# Altium footprint library PHOENIX THD.PcbLib: 109 footprints (part 5 of 8)
Each footprint in its own frame and in the unit in brackets; x right, y up, seen from the top. Pads: shape width x height; smd on the part's side, far side on the other; paste and mask are expansions set on the pad; w line width, h text height; cw(c..) or ccw(c..) is an arc to the next point about the centre after c.
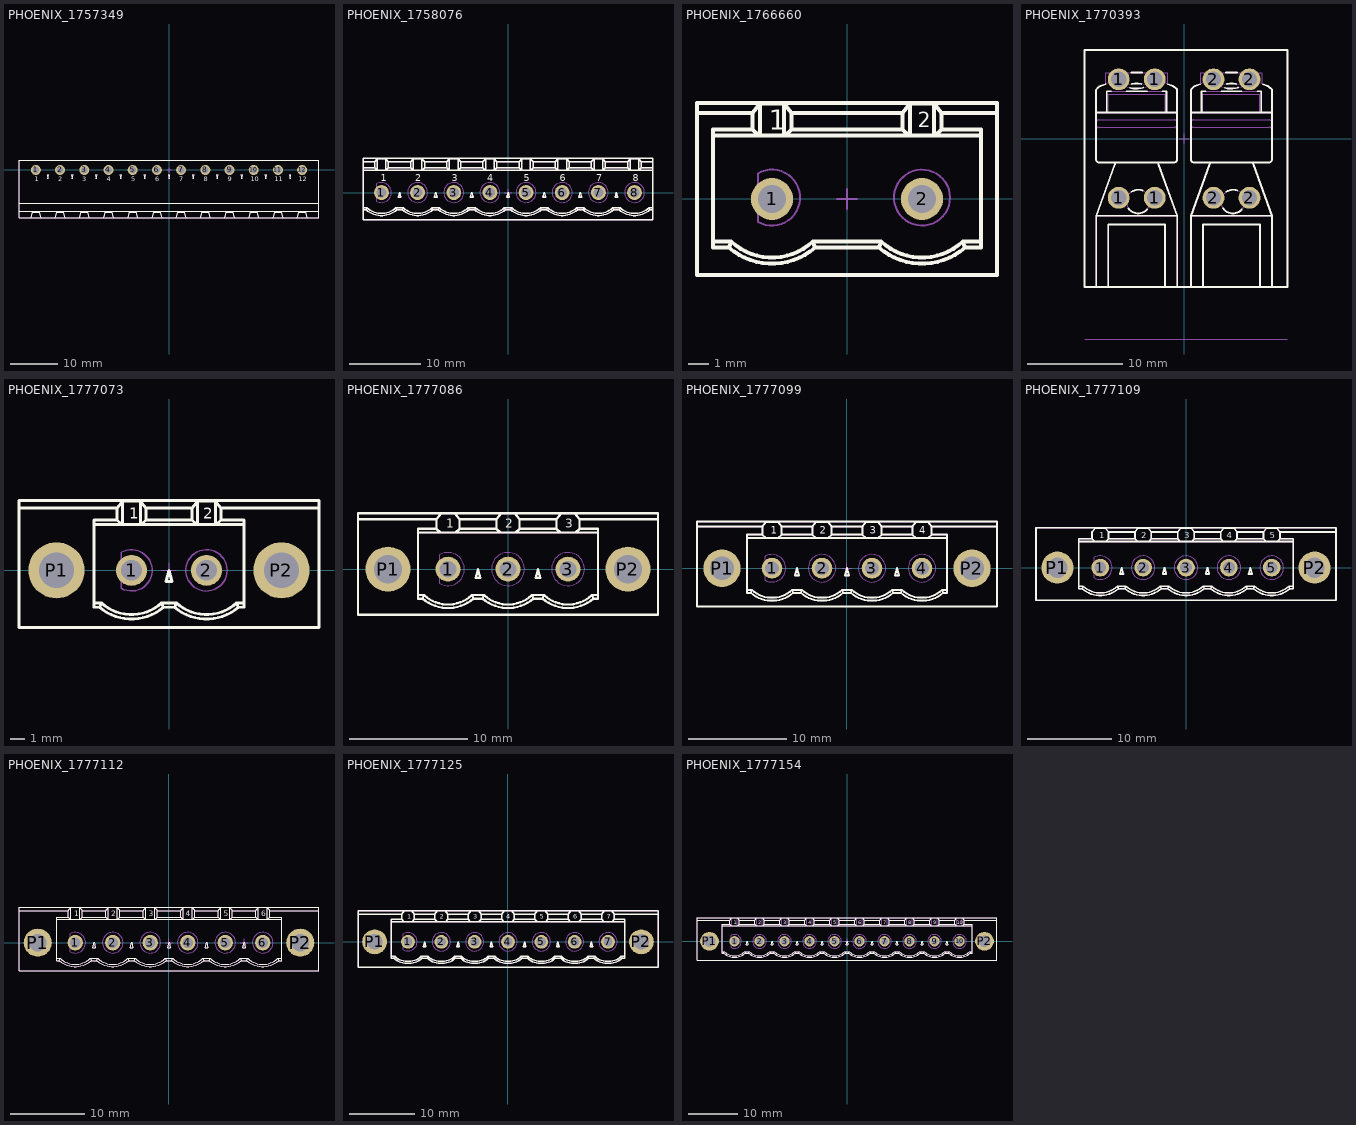
[diagram p4: the footprints below, top view; thin cyan lines are the x and y axes]

## PHOENIX_1757349 [mm] "PHOENIX MSTBA Serie, Pitch 5.08mm, 12A, 250V, 12 Positions Header"
height 8.6
pads (12):
  round 2.1 hole 1.4: 1(-27.94,0) 2(-22.86,0) 3(-17.78,0) 4(-12.7,0) 5(-7.62,0) 6(-2.54,0) 7(2.54,0) 8(7.62,0) 9(12.7,0) 10(17.78,0) 11(22.86,0) 12(27.94,0)
Top Overlay:
  lines w0.2: -31.48,-8.626 31.48,-8.626 ; -31.48,-7 31.48,-7 ; -28.915,-10 -28.545,-8.7 -27.335,-8.7 -26.965,-10 ; -28.596,-8.88 -27.284,-8.88 ; -28.185,-8.7 -28.172,-8.75 -27.708,-8.75 -27.695,-8.7 ; -23.835,-10 -23.465,-8.7 -22.255,-8.7 -21.885,-10 ; -23.516,-8.88 -22.204,-8.88 ; -23.105,-8.7 -23.092,-8.75 -22.628,-8.75 -22.615,-8.7 ; -18.755,-10 -18.385,-8.7 -17.175,-8.7 -16.805,-10 ; -18.436,-8.88 -17.124,-8.88 ; -18.025,-8.7 -18.012,-8.75 -17.548,-8.75 -17.535,-8.7 ; -13.675,-10 -13.305,-8.7 -12.095,-8.7 -11.725,-10 ; -13.356,-8.88 -12.044,-8.88 ; -12.945,-8.7 -12.932,-8.75 -12.468,-8.75 -12.455,-8.7 ; -8.595,-10 -8.225,-8.7 -7.015,-8.7 -6.645,-10 ; -8.276,-8.88 -6.964,-8.88 ; -7.865,-8.7 -7.852,-8.75 -7.388,-8.75 -7.375,-8.7 ; -3.515,-10 -3.145,-8.7 -1.935,-8.7 -1.565,-10 ; -3.196,-8.88 -1.884,-8.88 ; -2.785,-8.7 -2.772,-8.75 -2.308,-8.75 -2.295,-8.7 ; 1.565,-10 1.935,-8.7 3.145,-8.7 3.515,-10 ; 1.884,-8.88 3.196,-8.88 ; 2.295,-8.7 2.308,-8.75 2.772,-8.75 2.785,-8.7 ; 6.645,-10 7.015,-8.7 8.225,-8.7 8.595,-10 ; 6.964,-8.88 8.276,-8.88 ; 7.375,-8.7 7.388,-8.75 7.852,-8.75 7.865,-8.7 ; 11.725,-10 12.095,-8.7 13.305,-8.7 13.675,-10 ; 12.044,-8.88 13.356,-8.88 ; 12.455,-8.7 12.468,-8.75 12.932,-8.75 12.945,-8.7 ; 16.805,-10 17.175,-8.7 18.385,-8.7 18.755,-10 ; 17.124,-8.88 18.436,-8.88 ; 17.535,-8.7 17.548,-8.75 18.012,-8.75 18.025,-8.7 ; 21.885,-10 22.255,-8.7 23.465,-8.7 23.835,-10 ; 22.204,-8.88 23.516,-8.88 ; 22.615,-8.7 22.628,-8.75 23.092,-8.75 23.105,-8.7 ; 26.965,-10 27.335,-8.7 28.545,-8.7 28.915,-10 ; 27.284,-8.88 28.596,-8.88 ; 27.695,-8.7 27.708,-8.75 28.172,-8.75 28.185,-8.7 ; -31.48,-10 -31.48,2 31.48,2 31.48,-10 -31.48,-10 ; -25.601,-1.05 -25.4,-1.8 -25.199,-1.05 -25.601,-1.05 ; -20.521,-1.05 -20.32,-1.8 -20.119,-1.05 -20.521,-1.05 ; -15.441,-1.05 -15.24,-1.8 -15.039,-1.05 -15.441,-1.05 ; -10.361,-1.05 -10.16,-1.8 -9.959,-1.05 -10.361,-1.05 ; -5.281,-1.05 -5.08,-1.8 -4.879,-1.05 -5.281,-1.05 ; -0.201,-1.05 0,-1.8 0.201,-1.05 -0.201,-1.05 ; 4.879,-1.05 5.08,-1.8 5.281,-1.05 4.879,-1.05 ; 9.959,-1.05 10.16,-1.8 10.361,-1.05 9.959,-1.05 ; 15.039,-1.05 15.24,-1.8 15.441,-1.05 15.039,-1.05 ; 20.119,-1.05 20.32,-1.8 20.521,-1.05 20.119,-1.05 ; 25.199,-1.05 25.4,-1.8 25.601,-1.05 25.199,-1.05
  text "10" at 17.12,-2.4 h1
  text "9" at 12.38,-2.4 h1
  text "8" at 7.3,-2.4 h1
  text "5" at -7.9,-2.4 h1
  text "6" at -2.9,-2.4 h1
  text "7" at 2.1,-2.4 h1
  text "4" at -13.02,-2.4 h1
  text "1" at -28.22,-2.4 h1
  text "2" at -23.22,-2.4 h1
  text "3" at -18.22,-2.4 h1
  text "11" at 22.2,-2.4 h1
  text "12" at 27.28,-2.4 h1
Mechanical 8:
  lines w0.1: -3.04,0 -2.54,0 ; -2.54,-0.5 -2.54,0 ; -2.54,0.5 -2.54,0 ; -2.04,0 -2.54,0 ; -0.5,0 0,0 ; 0,-0.5 0,0 ; 0,0.5 0,0 ; 0.5,0 0,0 ; -27.94,0 -28.44,0 -27.94,0 ; -27.94,0 -27.94,-0.5 -27.94,0 ; -27.94,0 -27.44,0 -27.94,0 ; -27.94,0 -27.94,0.5 -27.94,0 ; -22.86,0 -23.36,0 -22.86,0 ; -22.86,0 -22.86,-0.5 -22.86,0 ; -22.86,0 -22.36,0 -22.86,0 ; -22.86,0 -22.86,0.5 -22.86,0 ; -17.78,0 -18.28,0 -17.78,0 ; -17.78,0 -17.78,-0.5 -17.78,0 ; -17.78,0 -17.28,0 -17.78,0 ; -17.78,0 -17.78,0.5 -17.78,0 ; -12.7,0 -13.2,0 -12.7,0 ; -12.7,0 -12.7,-0.5 -12.7,0 ; -12.7,0 -12.2,0 -12.7,0 ; -12.7,0 -12.7,0.5 -12.7,0 ; 2.54,0 2.04,0 2.54,0 ; 2.54,0 2.54,-0.5 2.54,0 ; 2.54,0 3.04,0 2.54,0 ; 2.54,0 2.54,0.5 2.54,0 ; 7.62,0 7.12,0 7.62,0 ; 7.62,0 7.62,-0.5 7.62,0 ; 7.62,0 8.12,0 7.62,0 ; 7.62,0 7.62,0.5 7.62,0 ; 12.7,0 12.2,0 12.7,0 ; 12.7,0 12.7,-0.5 12.7,0 ; 12.7,0 13.2,0 12.7,0 ; 12.7,0 12.7,0.5 12.7,0 ; 17.78,0 17.28,0 17.78,0 ; 17.78,0 17.78,-0.5 17.78,0 ; 17.78,0 18.28,0 17.78,0 ; 17.78,0 17.78,0.5 17.78,0 ; 22.86,0 22.36,0 22.86,0 ; 22.86,0 22.86,-0.5 22.86,0 ; 22.86,0 23.36,0 22.86,0 ; 22.86,0 22.86,0.5 22.86,0 ; 27.94,0 27.44,0 27.94,0 ; 27.94,0 27.94,-0.5 27.94,0 ; 27.94,0 28.44,0 27.94,0 ; 27.94,0 27.94,0.5 27.94,0
Mechanical 14:
  lines w0.1: -31.48,-8.626 31.48,-8.626 ; -31.48,-7 31.48,-7 ; -28.915,-10 -28.545,-8.7 -27.335,-8.7 -26.965,-10 ; -28.596,-8.88 -27.284,-8.88 ; -28.185,-8.7 -28.172,-8.75 -27.708,-8.75 -27.695,-8.7 ; -23.835,-10 -23.465,-8.7 -22.255,-8.7 -21.885,-10 ; -23.516,-8.88 -22.204,-8.88 ; -23.105,-8.7 -23.092,-8.75 -22.628,-8.75 -22.615,-8.7 ; -18.755,-10 -18.385,-8.7 -17.175,-8.7 -16.805,-10 ; -18.436,-8.88 -17.124,-8.88 ; -18.025,-8.7 -18.012,-8.75 -17.548,-8.75 -17.535,-8.7 ; -13.675,-10 -13.305,-8.7 -12.095,-8.7 -11.725,-10 ; -13.356,-8.88 -12.044,-8.88 ; -12.945,-8.7 -12.932,-8.75 -12.468,-8.75 -12.455,-8.7 ; -8.595,-10 -8.225,-8.7 -7.015,-8.7 -6.645,-10 ; -8.276,-8.88 -6.964,-8.88 ; -7.865,-8.7 -7.852,-8.75 -7.388,-8.75 -7.375,-8.7 ; -3.515,-10 -3.145,-8.7 -1.935,-8.7 -1.565,-10 ; -3.196,-8.88 -1.884,-8.88 ; -2.785,-8.7 -2.772,-8.75 -2.308,-8.75 -2.295,-8.7 ; 1.565,-10 1.935,-8.7 3.145,-8.7 3.515,-10 ; 1.884,-8.88 3.196,-8.88 ; 2.295,-8.7 2.308,-8.75 2.772,-8.75 2.785,-8.7 ; 6.645,-10 7.015,-8.7 8.225,-8.7 8.595,-10 ; 6.964,-8.88 8.276,-8.88 ; 7.375,-8.7 7.388,-8.75 7.852,-8.75 7.865,-8.7 ; 11.725,-10 12.095,-8.7 13.305,-8.7 13.675,-10 ; 12.044,-8.88 13.356,-8.88 ; 12.455,-8.7 12.468,-8.75 12.932,-8.75 12.945,-8.7 ; 16.805,-10 17.175,-8.7 18.385,-8.7 18.755,-10 ; 17.124,-8.88 18.436,-8.88 ; 17.535,-8.7 17.548,-8.75 18.012,-8.75 18.025,-8.7 ; 21.885,-10 22.255,-8.7 23.465,-8.7 23.835,-10 ; 22.204,-8.88 23.516,-8.88 ; 22.615,-8.7 22.628,-8.75 23.092,-8.75 23.105,-8.7 ; 26.965,-10 27.335,-8.7 28.545,-8.7 28.915,-10 ; 27.284,-8.88 28.596,-8.88 ; 27.695,-8.7 27.708,-8.75 28.172,-8.75 28.185,-8.7 ; -31.48,-10 -31.48,2 31.48,2 31.48,-10 -31.48,-10 ; -25.601,-1.05 -25.4,-1.8 -25.199,-1.05 -25.601,-1.05 ; -20.521,-1.05 -20.32,-1.8 -20.119,-1.05 -20.521,-1.05 ; -15.441,-1.05 -15.24,-1.8 -15.039,-1.05 -15.441,-1.05 ; -10.361,-1.05 -10.16,-1.8 -9.959,-1.05 -10.361,-1.05 ; -5.281,-1.05 -5.08,-1.8 -4.879,-1.05 -5.281,-1.05 ; -0.201,-1.05 0,-1.8 0.201,-1.05 -0.201,-1.05 ; 4.879,-1.05 5.08,-1.8 5.281,-1.05 4.879,-1.05 ; 9.959,-1.05 10.16,-1.8 10.361,-1.05 9.959,-1.05 ; 15.039,-1.05 15.24,-1.8 15.441,-1.05 15.039,-1.05 ; 20.119,-1.05 20.32,-1.8 20.521,-1.05 20.119,-1.05 ; 25.199,-1.05 25.4,-1.8 25.601,-1.05 25.199,-1.05
3D body "PHOENIX_1757349.stp": height 8.6, standoff -3.5, extent -31.48,-10 31.48,2.002

## PHOENIX_1758076 [mm] "12A, 320V, Pitch 5.08mm, 8 Positions Header"
height 12
pads (8):
  round 2.1 hole 1.4: 1(-17.78,0) 2(-12.7,0) 3(-7.62,0) 4(-2.54,0) 5(2.54,0) 6(7.62,0) 7(12.7,0) 8(17.78,0)
Top Overlay:
  drawing of 166 lines, arcs and shapes, not listed
  text "2" at -13,1.6 h1
  text "3" at -7.9,1.6 h1
  text "4" at -2.9,1.6 h1
  text "5" at 2.2,1.6 h1
  text "6" at 7.3,1.6 h1
  text "7" at 12.4,1.6 h1
  text "1" at -17.9,1.6 h1
  text "8" at 17.5,1.6 h1
Mechanical 8:
  lines w0.05: -18.28,0 -17.78,0 ; -17.78,-0.5 -17.78,0 ; -17.78,0.5 -17.78,0 ; -17.28,0 -17.78,0 ; -13.2,0 -12.7,0 ; -12.7,-0.5 -12.7,0 ; -12.7,0.5 -12.7,0 ; -12.2,0 -12.7,0 ; -8.12,0 -7.62,0 ; -7.62,-0.5 -7.62,0 ; -7.62,0.5 -7.62,0 ; -7.12,0 -7.62,0 ; -3.04,0 -2.54,0 ; -2.54,-0.5 -2.54,0 ; -2.54,0.5 -2.54,0 ; -2.04,0 -2.54,0 ; -0.5,0 0,0 ; 0,-0.5 0,0 ; 0,0.5 0,0 ; 0.5,0 0,0 ; 2.04,0 2.54,0 ; 2.54,-0.5 2.54,0 ; 2.54,0.5 2.54,0 ; 3.04,0 2.54,0 ; 7.12,0 7.62,0 ; 7.62,-0.5 7.62,0 ; 7.62,0.5 7.62,0 ; 8.12,0 7.62,0 ; 12.2,0 12.7,0 ; 12.7,-0.5 12.7,0 ; 12.7,0.5 12.7,0 ; 13.2,0 12.7,0 ; 17.28,0 17.78,0 ; 17.78,-0.5 17.78,0 ; 17.78,0.5 17.78,0 ; 18.28,0 17.78,0
Mechanical 14:
  drawing of 271 lines, arcs and shapes, not listed
  text "2" at -13,1.6 h1
  text "3" at -7.9,1.6 h1
  text "4" at -2.9,1.6 h1
  text "5" at 2.2,1.6 h1
  text "6" at 7.3,1.6 h1
  text "7" at 12.4,1.6 h1
  text "8" at 17.5,1.6 h1
  text "1" at -17.9,1.6 h1
3D body "PHOENIX_1758076.stp": height 12, standoff -3.9, extent -20.32,-3.8 20.32,4.8

## PHOENIX_1766660 [mm] "PCB Header, 12A 400 V, Pitch: 7.5mm, 2 Positions, GMSTBVA Serie"
height 12
pads (2):
  round 2.1 hole 1.4: 1(-3.75,0) 2(3.75,0)
Top Overlay:
  lines w0.2: -7.5,4.3 -4.725,4.3 ; -6.7,-2.13 -5.79,-2.13 ; -6.7,3.163 6.7,3.163 ; -4.394,3.163 -4.725,3.475 ; -4.355,3.163 -4.355,4.773 ; -3.145,3.163 -3.145,4.773 ; -3.106,3.163 -2.775,3.475 ; 3.106,3.163 2.775,3.475 ; 3.145,3.163 3.145,4.773 ; 4.355,3.163 4.355,4.773 ; 4.394,3.163 4.725,3.475 ; 6.7,-2.13 5.79,-2.13 ; 7.5,4.3 4.725,4.3 ; -5.904,-2.43 ccw(c-3.75,0.07) -1.596,-2.43 ; -5.904,-2.43 -5.79,-2.13 ; -5.904,-2.43 -6.7,-2.43 -6.7,3.475 -4.725,3.475 ; -5.79,-2.13 ccw(c-3.75,0.07) -1.71,-2.13 ; -4.725,3.475 -4.725,4.3 ; -4.725,4.3 -4.355,4.773 ; -4.355,4.773 -3.145,4.773 ; -3.145,4.773 -2.775,4.3 ; -2.775,3.475 2.775,3.475 ; -2.775,3.475 -2.775,4.3 ; -2.775,4.3 2.775,4.3 ; -1.71,-2.13 1.71,-2.13 ; -1.71,-2.13 -1.596,-2.43 ; -1.596,-2.43 1.596,-2.43 ; 1.596,-2.43 ccw(c3.75,0.07) 5.904,-2.43 ; 1.596,-2.43 1.71,-2.13 ; 1.71,-2.13 ccw(c3.75,0.07) 5.79,-2.13 ; 2.775,3.475 2.775,4.3 ; 2.775,4.3 3.145,4.773 ; 3.145,4.773 4.355,4.773 ; 4.355,4.773 4.725,4.3 ; 4.725,3.475 4.725,4.3 ; 4.725,3.475 6.7,3.475 6.7,-2.43 5.904,-2.43 ; 5.79,-2.13 5.904,-2.43 ; -7.5,-3.8 -7.5,4.8 7.5,4.8 7.5,-3.8 -7.5,-3.8
  text "1" at -3.91,3.46 h1
  text "2" at 3.53,3.575 h0.75
Mechanical 8:
  lines w0.1: -4.25,0 -3.75,0 ; -3.75,-0.5 -3.75,0 ; -3.75,0.5 -3.75,0 ; -3.25,0 -3.75,0 ; -0.5,0 0,0 ; 0,-0.5 0,0 ; 0,0.5 0,0 ; 0.5,0 0,0 ; 3.25,0 3.75,0 ; 3.75,-0.5 3.75,0 ; 3.75,0.5 3.75,0 ; 4.25,0 3.75,0
Mechanical 14:
  circle w0.1: c3.75,0.07 r1.4
  lines w0.1: -7.5,4.3 -4.725,4.3 ; -6.7,-2.13 -5.79,-2.13 ; -6.7,3.163 6.7,3.163 ; -4.394,3.163 -4.725,3.475 ; -4.355,3.163 -4.355,4.773 ; -3.145,3.163 -3.145,4.773 ; -3.106,3.163 -2.775,3.475 ; 3.106,3.163 2.775,3.475 ; 3.145,3.163 3.145,4.773 ; 4.355,3.163 4.355,4.773 ; 4.394,3.163 4.725,3.475 ; 6.7,-2.13 5.79,-2.13 ; 7.5,4.3 4.725,4.3 ; -5.904,-2.43 ccw(c-3.75,0.07) -1.596,-2.43 ; -5.904,-2.43 -5.79,-2.13 ; -5.904,-2.43 -6.7,-2.43 -6.7,3.475 -4.725,3.475 ; -5.79,-2.13 ccw(c-3.75,0.07) -1.71,-2.13 ; -4.725,3.475 -4.725,4.3 ; -4.725,4.3 -4.355,4.773 ; -4.355,4.773 -3.145,4.773 ; -3.145,4.773 -2.775,4.3 ; -2.775,3.475 2.775,3.475 ; -2.775,3.475 -2.775,4.3 ; -2.775,4.3 2.775,4.3 ; -1.71,-2.13 1.71,-2.13 ; -1.71,-2.13 -1.596,-2.43 ; -1.596,-2.43 1.596,-2.43 ; 1.596,-2.43 ccw(c3.75,0.07) 5.904,-2.43 ; 1.596,-2.43 1.71,-2.13 ; 1.71,-2.13 ccw(c3.75,0.07) 5.79,-2.13 ; 2.775,3.475 2.775,4.3 ; 2.775,4.3 3.145,4.773 ; 3.145,4.773 4.355,4.773 ; 4.355,4.773 4.725,4.3 ; 4.725,3.475 4.725,4.3 ; 4.725,3.475 6.7,3.475 6.7,-2.43 5.904,-2.43 ; 5.79,-2.13 5.904,-2.43 ; -7.5,-3.8 -7.5,4.8 7.5,4.8 7.5,-3.8 -7.5,-3.8 ; -4.45,-1.142 ccw(c-3.75,0.07) -4.45,1.282 -4.45,-1.142
  text "1" at -3.91,3.46 h1
  text "2" at 3.53,3.575 h0.75
3D body "PHOENIX_1766660.stp": height 12, standoff -3.9, extent -7.5,-3.8 7.5,4.8

## PHOENIX_1770393 [mm] "76A 400V PCB Terminal Block, Pitch 10mm, 2 Positions, Push-Lock Spring Connection (Conductor/PCB connection direction: 0°)"
height 49.7
pads (8):
  round 2.3 hole 1.6: 1(-6.9,-6.25) 1(-6.9,6.25) 1(-3.1,-6.25) 1(-3.1,6.25) 2(3.1,-6.25) 2(3.1,6.25) 2(6.9,-6.25) 2(6.9,6.25)
Top Overlay:
  lines w0.2: -9.285,2.735 -0.735,2.735 ; -9.275,-15.65 -9.275,-8.15 ; -8.307,5.73 -8.835,5.536 ccw(c-8.537,4.784) -9.277,5.11 ccw(c-9.185,5.07) -9.285,5.07 -9.285,-2.218 ccw(c-8.985,-2.218) -8.985,-2.518 -1.035,-2.518 ccw(c-1.035,-2.218) -0.735,-2.218 -0.735,5.141 ccw(c-0.835,5.141) -0.764,5.212 ccw(c-2.197,3.784) -1.186,5.536 -1.695,5.726 ; -8.16,2.735 -8.16,4.991 -7.715,4.991 ; -8,-15.65 -8,-9.055 -2,-9.055 -2,-15.598 ; -7.256,-2.518 cw(c-8.25,-2.41) -7.31,-2.752 -9.275,-8.15 ; -6.085,4.991 -3.916,4.991 ; -5.884,-7.353 ccw(c-4.85,-6.65) -3.932,-7.498 ; -5.695,5.357 ccw(c-5.02,7.886) -4.312,5.366 ; -5.573,6.95 -4.428,6.95 ; -5.544,-5.61 cw(c-4.85,-6.65) -4.392,-5.487 ; -5.48,5.767 cw(c-4.998,2.014) -4.525,5.769 ; -2.744,-2.518 ccw(c-1.75,-2.41) -2.69,-2.752 -0.725,-8.15 ; -2.285,4.991 -1.86,4.991 -1.86,2.735 ; -0.725,-15.65 -0.725,-8.15 ; 0.725,-15.65 0.725,-8.15 ; 1.693,5.73 1.165,5.536 ccw(c1.463,4.784) 0.723,5.11 ccw(c0.815,5.07) 0.715,5.07 0.715,-2.218 ccw(c1.015,-2.218) 1.015,-2.518 8.965,-2.518 ccw(c8.965,-2.218) 9.265,-2.218 9.265,5.141 ccw(c9.165,5.141) 9.236,5.212 ccw(c7.803,3.784) 8.814,5.536 8.305,5.726 ; 1.84,2.735 1.84,4.991 2.285,4.991 ; 2,-15.65 2,-9.055 8,-9.055 8,-15.65 ; 2.744,-2.518 cw(c1.75,-2.41) 2.69,-2.752 0.725,-8.15 ; 3.915,4.991 6.084,4.991 ; 4.116,-7.353 ccw(c5.15,-6.65) 6.068,-7.498 ; 4.305,5.357 ccw(c4.98,7.886) 5.688,5.366 ; 4.427,6.95 5.572,6.95 ; 4.456,-5.61 cw(c5.15,-6.65) 5.608,-5.487 ; 4.52,5.767 cw(c5.002,2.014) 5.475,5.769 ; 7.256,-2.518 ccw(c8.25,-2.41) 7.31,-2.752 9.275,-8.15 ; 7.715,4.991 8.14,4.991 8.14,2.735 ; 9.265,2.735 0.715,2.735 9.265,2.735 ; 9.275,-15.65 9.275,-8.15 ; -9.275,-8.15 -0.725,-8.15 ; 0.725,-8.15 9.275,-8.15 ; -10.5,-15.65 10.9,-15.65 10.9,9.35 -10.5,9.35 -10.5,-15.65
Mechanical 8:
  lines w0.05: -10.5,-21.15 10.9,-21.15 ; -7.4,-6.25 -6.9,-6.25 ; -7.4,6.25 -6.9,6.25 ; -6.9,-6.75 -6.9,-6.25 ; -6.9,-5.75 -6.9,-6.25 ; -6.9,5.75 -6.9,6.25 ; -6.9,6.75 -6.9,6.25 ; -6.4,-6.25 -6.9,-6.25 ; -6.4,6.25 -6.9,6.25 ; -3.6,-6.25 -3.1,-6.25 ; -3.6,6.25 -3.1,6.25 ; -3.1,-6.75 -3.1,-6.25 ; -3.1,-5.75 -3.1,-6.25 ; -3.1,5.75 -3.1,6.25 ; -3.1,6.75 -3.1,6.25 ; -2.6,-6.25 -3.1,-6.25 ; -2.6,6.25 -3.1,6.25 ; -0.5,0 0,0 ; 0,-0.5 0,0 ; 0,0.5 0,0 ; 0.5,0 0,0 ; 2.6,-6.25 3.1,-6.25 ; 2.6,6.25 3.1,6.25 ; 3.1,-6.75 3.1,-6.25 ; 3.1,-5.75 3.1,-6.25 ; 3.1,5.75 3.1,6.25 ; 3.1,6.75 3.1,6.25 ; 3.6,-6.25 3.1,-6.25 ; 3.6,6.25 3.1,6.25 ; 6.4,-6.25 6.9,-6.25 ; 6.4,6.25 6.9,6.25 ; 6.9,-6.75 6.9,-6.25 ; 6.9,-5.75 6.9,-6.25 ; 6.9,5.75 6.9,6.25 ; 6.9,6.75 6.9,6.25 ; 7.4,-6.25 6.9,-6.25 ; 7.4,6.25 6.9,6.25
Mechanical 14:
  circle w0.1: c5.15,-6.65 r1.25
  circle w0.1: c-4.85,-6.65 r1.25
  lines w0.1: -9.285,0.907 cw(c-8.985,0.907) -8.985,1.207 -1.035,1.207 cw(c-1.035,0.907) -0.735,0.907 ; -9.285,1.671 cw(c-8.985,1.671) -8.985,1.971 -1.035,1.971 cw(c-1.035,1.671) -0.735,1.671 ; -9.285,2.435 cw(c-8.985,2.435) -8.985,2.735 -1.035,2.735 cw(c-1.035,2.435) -0.735,2.435 ; -9.275,-15.65 -9.275,-8.15 ; -8.25,5.826 -8.25,6.95 -1.75,6.95 -1.75,5.816 ; -8.16,2.735 -8.16,4.991 -1.86,4.991 -1.86,2.735 ; -8.01,2.735 -8.01,4.656 -2.01,4.656 -2.01,2.735 ; -8,-15.65 -8,-9.055 -2,-9.055 -2,-15.598 ; -7.26,6.95 -7.26,6.317 -8.835,5.536 ccw(c-8.537,4.784) -9.277,5.11 ccw(c-9.185,5.07) -9.285,5.07 -9.285,-2.218 ccw(c-8.985,-2.218) -8.985,-2.518 -1.035,-2.518 ccw(c-1.035,-2.218) -0.735,-2.218 -0.735,5.141 ccw(c-0.835,5.141) -0.764,5.212 ccw(c-2.197,3.784) -1.186,5.536 -2.76,6.317 -2.76,6.95 ; -7.256,-2.518 cw(c-8.25,-2.41) -7.31,-2.752 -9.275,-8.15 ; -2.744,-2.518 ccw(c-1.75,-2.41) -2.69,-2.752 -0.725,-8.15 ; -0.725,-15.65 -0.725,-8.15 ; 0.715,0.907 cw(c1.015,0.907) 1.015,1.207 8.965,1.207 cw(c8.965,0.907) 9.265,0.907 ; 0.715,1.671 cw(c1.015,1.671) 1.015,1.971 8.965,1.971 cw(c8.965,1.671) 9.265,1.671 ; 0.715,2.435 cw(c1.015,2.435) 1.015,2.735 8.965,2.735 cw(c8.965,2.435) 9.265,2.435 ; 0.725,-15.65 0.725,-8.15 ; 1.75,5.826 1.75,6.95 8.25,6.95 8.25,5.816 ; 1.84,2.735 1.84,4.991 8.14,4.991 8.14,2.735 ; 1.99,2.735 1.99,4.656 7.99,4.656 7.99,2.735 ; 2,-15.65 2,-9.055 8,-9.055 8,-15.65 ; 2.74,6.95 2.74,6.317 1.165,5.536 ccw(c1.463,4.784) 0.723,5.11 ccw(c0.815,5.07) 0.715,5.07 0.715,-2.218 ccw(c1.015,-2.218) 1.015,-2.518 8.965,-2.518 ccw(c8.965,-2.218) 9.265,-2.218 9.265,5.141 ccw(c9.165,5.141) 9.236,5.212 ccw(c7.803,3.784) 8.814,5.536 7.24,6.317 7.24,6.95 ; 2.744,-2.518 cw(c1.75,-2.41) 2.69,-2.752 0.725,-8.15 ; 7.256,-2.518 ccw(c8.25,-2.41) 7.31,-2.752 9.275,-8.15 ; 9.275,-15.65 9.275,-8.15 ; -9.275,-8.15 -0.725,-8.15 ; 0.725,-8.15 9.275,-8.15 ; -10.5,-15.65 10.9,-15.65 10.9,9.35 -10.5,9.35 -10.5,-15.65 ; -6.261,5.581 ccw(c-5.02,7.886) -3.762,5.591 ccw(c-4.998,2.014) -6.261,5.581 ; 3.74,5.581 ccw(c4.98,7.886) 6.238,5.591 ccw(c5.003,2.014) 3.74,5.581
3D body "PHOENIX_1770393.stp": height 49.98, standoff -4.5, extent -10.5,-15.65 10.9,9.35

## PHOENIX_1777073 [mm] "PCB Header, 12A, 320V, Pitch: 5.08mm, 2 Positions, MSTBV Serie"
height 12
pads (4):
  round 2.1 hole 1.4: 1(-2.54,0) 2(2.54,0)
  round 3.8 hole 2.4: P1(-7.62,0) P2(7.62,0)
Top Overlay:
  lines w0.2: -10.16,4.23 -3.515,4.23 ; -5.08,-2.2 -4.58,-2.2 ; -5.08,3.093 5.08,3.093 ; -3.184,3.093 -3.515,3.405 ; -3.145,3.093 -3.145,4.703 ; -1.935,3.093 -1.935,4.703 ; -1.896,3.093 -1.565,3.405 ; 1.896,3.093 1.565,3.405 ; 1.935,3.093 1.935,4.703 ; 3.145,3.093 3.145,4.703 ; 3.184,3.093 3.515,3.405 ; 5.08,-2.2 4.58,-2.2 ; 10.16,4.23 3.515,4.23 ; -4.694,-2.5 ccw(c-2.54,0) -0.386,-2.5 ; -4.694,-2.5 -4.58,-2.2 ; -4.694,-2.5 -5.08,-2.5 -5.08,3.405 -3.515,3.405 ; -4.58,-2.2 ccw(c-2.54,0) -0.5,-2.2 ; -3.515,3.405 -3.515,4.23 ; -3.515,4.23 -3.145,4.703 ; -3.145,4.703 -1.935,4.703 ; -1.935,4.703 -1.565,4.23 ; -1.565,3.405 -1.565,4.23 ; -1.565,3.405 1.565,3.405 ; -1.565,4.23 1.565,4.23 ; -0.5,-2.2 0.5,-2.2 ; -0.5,-2.2 -0.386,-2.5 ; -0.386,-2.5 0.386,-2.5 ; 0.386,-2.5 ccw(c2.54,0) 4.694,-2.5 ; 0.386,-2.5 0.5,-2.2 ; 0.5,-2.2 ccw(c2.54,0) 4.58,-2.2 ; 1.565,3.405 1.565,4.23 ; 1.565,4.23 1.935,4.703 ; 1.935,4.703 3.145,4.703 ; 3.145,4.703 3.515,4.23 ; 3.515,3.405 3.515,4.23 ; 3.515,3.405 5.08,3.405 5.08,-2.5 4.694,-2.5 ; 4.58,-2.2 4.694,-2.5 ; -10.16,-3.87 10.16,-3.87 10.16,4.73 -10.16,4.73 -10.16,-3.87 ; -0.201,-0.75 0.201,-0.75 0,0 -0.201,-0.75
  text "2" at 2.32,3.505 h0.75
  text "1" at -2.68,3.505 h0.75
Mechanical 8:
  lines w0.05: -8.12,0 -7.62,0 ; -7.62,-0.5 -7.62,0 ; -7.62,0.5 -7.62,0 ; -7.12,0 -7.62,0 ; -3.04,0 -2.54,0 ; -2.54,-0.5 -2.54,0 ; -2.54,0.5 -2.54,0 ; -2.04,0 -2.54,0 ; 7.12,0 7.62,0 ; 7.62,-0.5 7.62,0 ; 7.62,0.5 7.62,0 ; 8.12,0 7.62,0 ; 0,0 0.5,0 0,0 ; 0,0 0,-0.5 0,0 ; 0,0 -0.5,0 0,0 ; 0,0 0,0.5 0,0 ; 2.54,0 3.04,0 2.54,0 ; 2.54,0 2.54,-0.5 2.54,0 ; 2.54,0 2.04,0 2.54,0 ; 2.54,0 2.54,0.5 2.54,0
Mechanical 14:
  circle w0.1: c2.54,0 r1.4
  circle w0.1: c-7.62,0 r1.25
  circle w0.1: c7.62,0 r1.25
  lines w0.1: -10.16,4.23 -3.515,4.23 ; -5.08,-2.2 -4.58,-2.2 ; -5.08,3.093 5.08,3.093 ; -3.184,3.093 -3.515,3.405 ; -3.145,3.093 -3.145,4.703 ; -1.935,3.093 -1.935,4.703 ; -1.896,3.093 -1.565,3.405 ; 1.896,3.093 1.565,3.405 ; 1.935,3.093 1.935,4.703 ; 3.145,3.093 3.145,4.703 ; 3.184,3.093 3.515,3.405 ; 5.08,-2.2 4.58,-2.2 ; 10.16,4.23 3.515,4.23 ; -4.694,-2.5 ccw(c-2.54,0) -0.386,-2.5 ; -4.694,-2.5 -4.58,-2.2 ; -4.694,-2.5 -5.08,-2.5 -5.08,3.405 -3.515,3.405 ; -4.58,-2.2 ccw(c-2.54,0) -0.5,-2.2 ; -3.515,3.405 -3.515,4.23 ; -3.515,4.23 -3.145,4.703 ; -3.145,4.703 -1.935,4.703 ; -3.04,-0.5 -2.04,-0.5 ; -3.04,-0.5 -3.04,0.5 ; -3.04,-0.5 -2.772,-0.232 ; -3.04,0.5 -2.04,0.5 ; -3.04,0.5 -2.772,0.232 ; -2.772,-0.232 -2.308,-0.232 ; -2.772,-0.232 -2.772,0.232 ; -2.772,0.232 -2.308,0.232 ; -2.308,-0.232 -2.308,0.232 ; -2.308,-0.232 -2.04,-0.5 ; -2.308,0.232 -2.04,0.5 ; -2.04,-0.5 -2.04,0.5 ; -1.935,4.703 -1.565,4.23 ; -1.565,3.405 -1.565,4.23 ; -1.565,3.405 1.565,3.405 ; -1.565,4.23 1.565,4.23 ; -0.5,-2.2 0.5,-2.2 ; -0.5,-2.2 -0.386,-2.5 ; -0.386,-2.5 0.386,-2.5 ; 0.386,-2.5 ccw(c2.54,0) 4.694,-2.5 ; 0.386,-2.5 0.5,-2.2 ; 0.5,-2.2 ccw(c2.54,0) 4.58,-2.2 ; 1.565,3.405 1.565,4.23 ; 1.565,4.23 1.935,4.703 ; 1.935,4.703 3.145,4.703 ; 2.04,-0.5 2.04,0.5 ; 2.04,-0.5 3.04,-0.5 ; 2.04,-0.5 2.308,-0.232 ; 2.04,0.5 3.04,0.5 ; 2.04,0.5 2.308,0.232 ; 2.308,-0.232 2.772,-0.232 ; 2.308,-0.232 2.308,0.232 ; 2.308,0.232 2.772,0.232 ; 2.772,-0.232 2.772,0.232 ; 2.772,-0.232 3.04,-0.5 ; 2.772,0.232 3.04,0.5 ; 3.04,-0.5 3.04,0.5 ; 3.145,4.703 3.515,4.23 ; 3.515,3.405 3.515,4.23 ; 3.515,3.405 5.08,3.405 5.08,-2.5 4.694,-2.5 ; 4.58,-2.2 4.694,-2.5 ; -10.16,-3.87 10.16,-3.87 10.16,4.73 -10.16,4.73 -10.16,-3.87 ; -3.24,-1.212 ccw(c-2.54,0) -3.24,1.212 -3.24,-1.212 ; -0.201,-0.75 0.201,-0.75 0,0 -0.201,-0.75
  text "1" at -2.68,3.505 h0.75
  text "2" at 2.32,3.505 h0.75
3D body "PHOENIX_1777073.stp": height 12, standoff -3.4, extent -10.16,-3.87 10.16,4.73
